# Altium footprint library rescap.PcbLib: 106 footprints (part 7 of 7)
Each footprint in its own frame and in the unit in brackets; x right, y up, seen from the top. Pads: shape width x height; smd on the part's side, far side on the other; paste and mask are expansions set on the pad; w line width, h text height; cw(c..) or ccw(c..) is an arc to the next point about the centre after c.
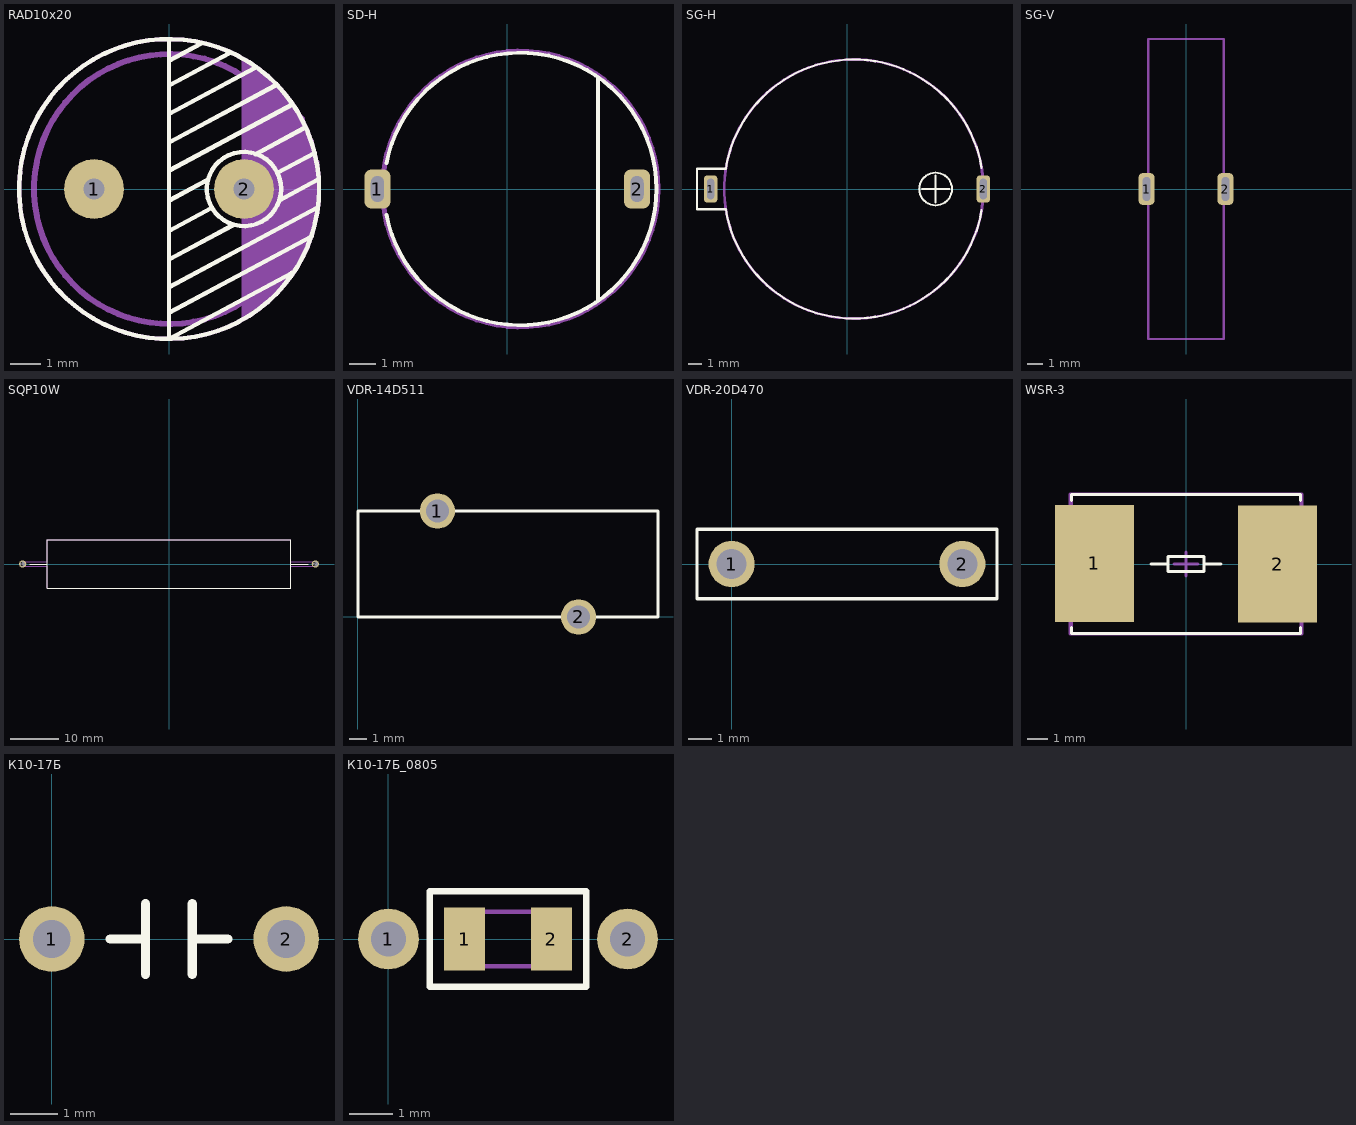
[diagram p6: the footprints below, top view; thin cyan lines are the x and y axes]

## RAD10x20 [mm]
height 20
pads (2):
  round 2 hole 0.7: 1(-2.5,0) 2(2.5,0)
Top Overlay:
  circle w0.15: c0,0 r5
  circle w0.15: c2.5,0 r1.237
  lines w0.15: 0,-4.125 4.751,-1.576 ; 0,-3.275 4.949,-0.62 ; 0,-2.35 2.128,-1.208 ; 0,-1.4 1.417,-0.639 ; 0,1.55 3.557,3.459 ; 0,2.5 2.859,4.034 ; 0,3.45 2.02,4.534 ; 0,4.275 1.076,4.852 ; 0,5 0,-5 4.1,-2.8 ; 0.025,-0.375 1.246,0.28 ; 0.025,0.625 4.125,2.825 ; 2.875,1.154 4.498,2.025 ; 3.6,0.532 4.859,1.207 ; 3.675,-0.378 4.968,0.316
Top Courtyard:
  circle w0.2: c0,0 r4.5
Mechanical 29:
  circle w0.15: c0,0 r5
  region: 2.425,4.4 2.425,-4.35 2.475,-4.35 2.8,-4.025 3,-4.025 3.65,-3.375 3.65,-3.325 3.7,-3.325 4.05,-2.975 4.05,-2.85 4.375,-2.525 4.375,-2.275 4.6,-2.05 4.6,-1.825 4.775,-1.65 4.775,-1.175 4.95,-1 4.95,-0.15 5,-0.1 5,0.925 4.825,1.1 4.825,1.625 4.525,1.925 4.525,2.375 3.9,3 3.9,3.175 3.225,3.85
  text ".Designator" at -3.9,-0.3 h1
3D body "cap5mm.STEP": height 15.1, standoff -2.4, extent -4.525,-4.475 4.485,4.525

## SD-H [mm]
height 6
pads (2):
  rrect50% 1x1.5 hole 0.5 slot 1 at 90 deg: 1(-5,0) 2(5,0)
Top Overlay:
  lines w0.15: -4.656,-0.991 ccw(c0.5,0) 5.75,0 ccw(c0.5,0) -4.656,0.991 ; 3.5,-4.3 3.5,4.3
Top Courtyard:
  circle w0.2: c0.5,0 r5.308
3D body: height 5.5, standoff 0.5, extent -3.5,-3.997 4.5,3.997
3D body: height 5.4, standoff 0.6, extent -4.75,-5.247 5.75,5.247

## SG-H [mm]
height 6
pads (2):
  rrect50% 1x2 hole 0.5 slot 1.5 at 90 deg: 1(-10,0) 2(10,0)
Top Overlay:
  circle w0.15: c6.5,0 r1.2
  lines w0.15: -8.895,1.483 -11,1.483 -11,-1.483 -8.884,-1.483 ; -8.884,-1.482 ccw(c0.5,0) 9.874,-1.543 ; -8.884,1.482 cw(c0.5,0) 9.874,1.543 ; 5.5,0 7.5,0 ; 6.5,-1 6.5,1
Top Courtyard:
  circle w0.2: c0.5,0 r9.505
3D body: height 5.4, standoff 0.6, extent -9,-9.497 10,9.497
3D body: height 5.7, standoff 2, extent -10.1,-1.3 -9.9,1.3
3D body: height 0.5, standoff 0.3, extent 0,-1.3 10.1,1.3
3D body: height 5.7, standoff -3, extent -10.1,-0.5 -9.9,0.5
3D body: height 0.5, standoff -3, extent 9.9,-0.5 10.1,0.5
3D body: height 5.7, standoff 5.5, extent -10.1,-1.3 0,1.3
3D body: height 5.5, standoff 0.5, extent -7.5,-8 8.5,8

## SG-V [mm]
height 6
pads (2):
  rrect50% 1x2 hole 0.5 slot 1.5 at 90 deg: 1(-2.5,0) 2(2.5,0)
Top Courtyard:
  lines w0.15: -2.4,-9.5 2.4,-9.5 2.4,9.5 -2.4,9.5 -2.4,-9.5
3D body: height 19.5, standoff 0.5, extent -2.4,-9.497 2.4,9.497
3D body: height 1, standoff -3, extent 2.4,-0.5 2.6,0.5
3D body: height 8, standoff 0.5, extent 2.6,-1.3 2.8,1.3
3D body: height 8, standoff 0.5, extent -2.8,-1.3 -2.6,1.3
3D body: height 1, standoff -3, extent -2.6,-0.5 -2.4,0.5
3D body: height 18, standoff 2, extent -2.5,-8 2.5,8

## SQP10W [mm]
height 10
pads (2):
  round 1.5 hole 1: 1(-30,0) 2(30,0)
Top Overlay:
  lines w0.15: -28.5,0 -25,0 ; 25,0 28.5,0 ; -25,-5 25,-5 25,5 -25,5 -25,-5
Top Courtyard:
  lines w0.15: -30,-0.5 -25,-0.5 -25,-5 0,-5 25,-5 25,-0.5 30,-0.5 30,0.5 25,0.5 25,5 0,5 -25,5 -25,0.5 -30,0.5 -30,-0.5
3D body "[res] SQP 10W.stp": height 10, standoff -4, extent -30.349,-5 30.349,5

## VDR-14D511 [mm]
pads (2):
  round 2 hole 1.3: 1(4.5,6) 2(12.5,0)
Top Overlay:
  lines w0.15: 0,0 17,0 17,6 0,6 0,0
3D body: height 14, standoff 0, extent 1.75,1.5 15.75,4.3

## VDR-20D470 [mm]
pads (2):
  round 2 hole 1.3: 1(0,0) 2(10,0)
Top Overlay:
  lines w0.15: -1.5,-1.5 11.5,-1.5 11.5,1.5 -1.5,1.5 -1.5,-1.5

## WSR-3 [mm]
height 2.4
pads (2):
  rect 3.94x5.84 smd: 1(-4.575,0.025) 2(4.575,0)
Top Overlay:
  lines w0.15: -5.73,-3.175 -5.73,-3.475 5.725,-3.475 5.725,-3.175 ; -5.73,3.175 -5.73,3.475 5.725,3.475 5.725,3.175 ; -1.75,0 -0.9,0 ; 1.75,0 0.9,0 ; -0.9,0 -0.9,0.375 0,0.375 0.9,0.375 0.9,0 ; -0.9,0 -0.9,-0.375 0,-0.375 0.9,-0.375 0.9,0
Top Courtyard:
  lines w0.15: -0.6,0 0,0 ; 0,-0.6 0,0 ; 0,0.6 0,0 ; 0.6,0 0,0 ; -5.8,-3.5 -5.8,3.5 5.8,3.5 5.8,-3.5 -5.8,-3.5
Mechanical 29:
  lines w0.15: -5.725,-3.475 -5.725,3.475 5.75,3.475 5.75,-3.475 -5.725,-3.475
  text ".Designator" at -2.9,-0.2 h1
3D body "WSR-3.STEP": height 2.43, standoff 0, extent -5.785,-3.465 5.775,3.515

## К10-17Б [mm]
pads (2):
  round 1.4 hole 0.8 unplated: 1(0,0) 2(5,0)
Top Overlay:
  lines w0.2: 1.25,0 2,0 ; 2,-0.75 2,0.75 ; 3,-0.75 3,0.75 ; 3,0 3.75,0

## К10-17Б_0805 [mm]
pads (4):
  round 1.4 hole 0.8 unplated: 1(0,0) 2(5.5,0)
  rect 0.95x1.45 smd: 1(1.75,0) 2(3.75,0)
Top Overlay:
  lines w0.15: 0.95,-1.1 4.55,-1.1 4.55,1.1 0.95,1.1 0.95,-1.1
Mechanical 13:
  lines w0.1: 1.725,-0.625 1.725,0.625 ; 3.775,-0.625 3.775,0.625 ; 1.75,-0.625 3.75,-0.625 3.75,0.625 1.75,0.625 1.75,-0.625
3D body "VJ0805A471JCAAJ.stp": height 1.45, standoff 0, extent 1.75,-0.625 3.75,0.625